# Altium footprint library Adafruit PyGamer1.PcbLib: 42 footprints (part 1 of 3)
Each footprint in its own frame and in the unit in brackets; x right, y up, seen from the top. Pads: shape width x height; smd on the part's side, far side on the other; paste and mask are expansions set on the pad; w line width, h text height; cw(c..) or ccw(c..) is an arc to the next point about the centre after c.
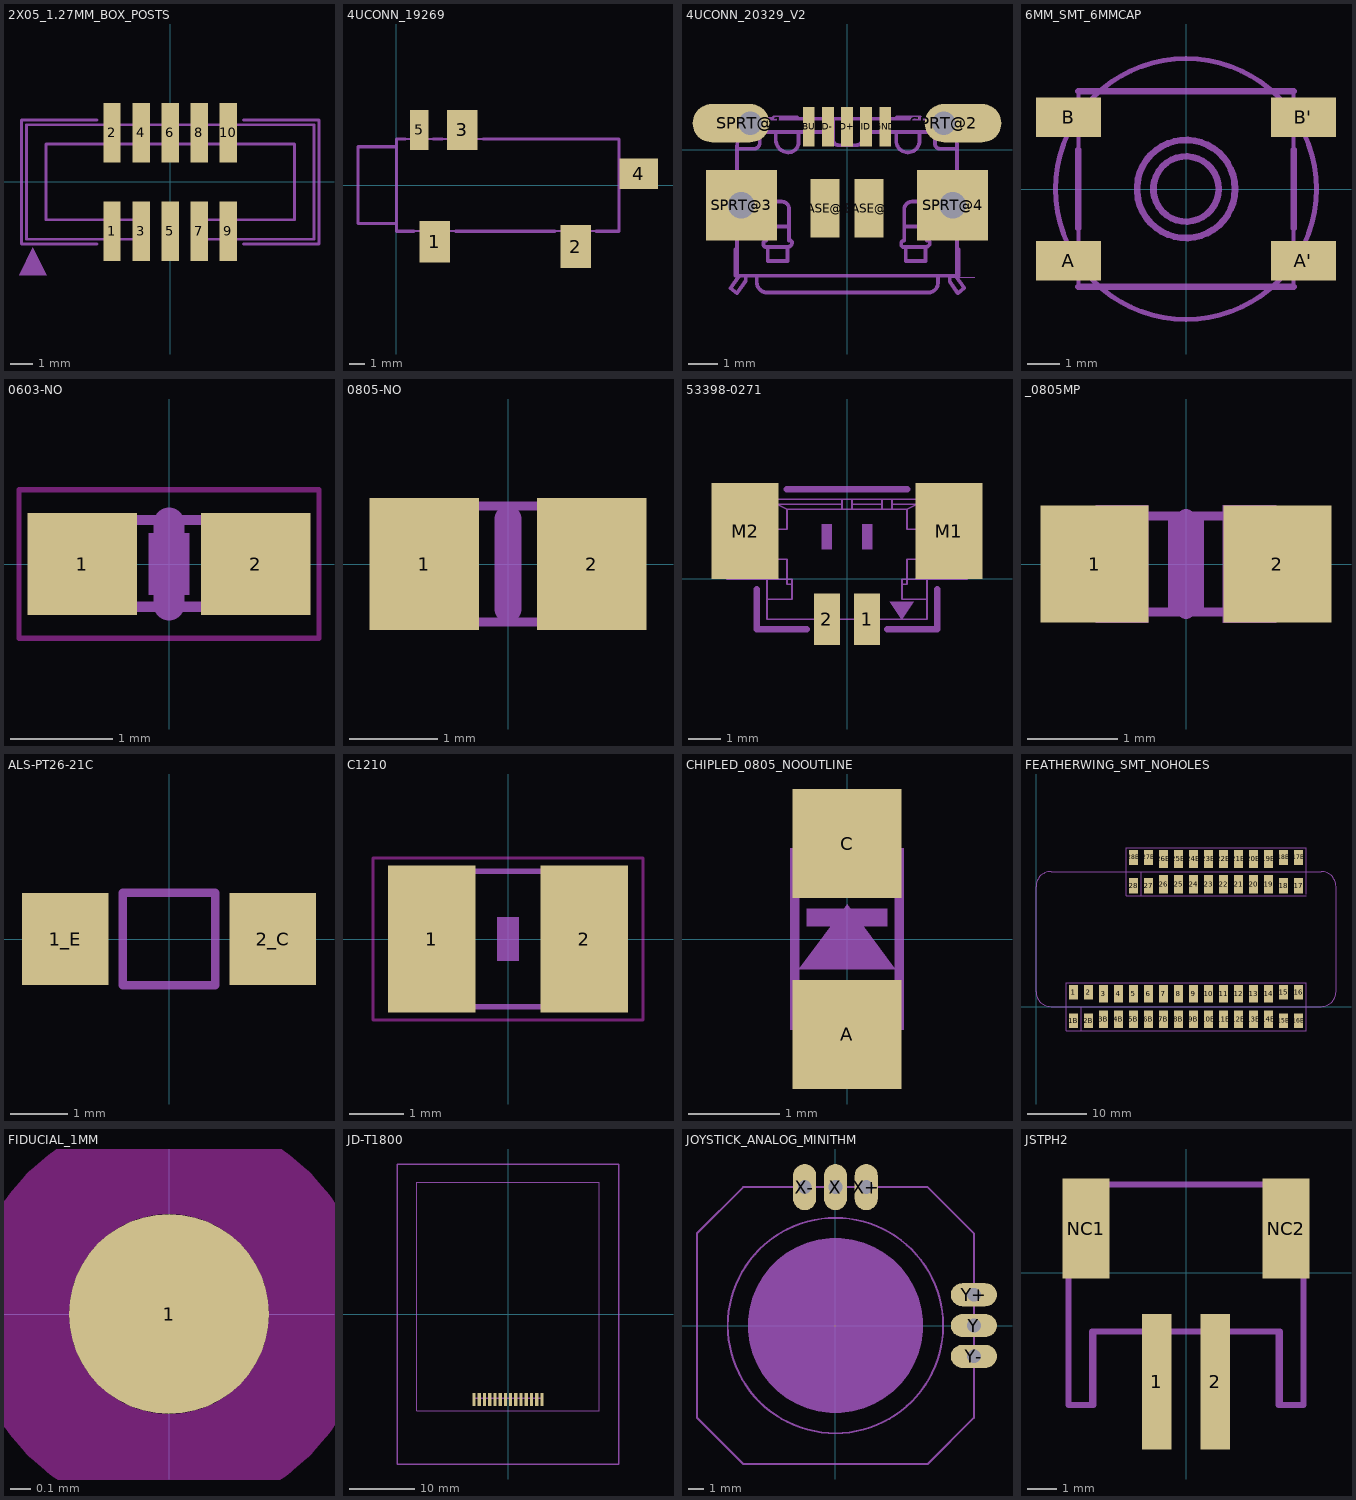
[diagram p0: the footprints below, top view; thin cyan lines are the x and y axes]

## 2X05_1.27MM_BOX_POSTS [mm]
pads (10):
  rect 0.76x2.6 smd: 1(-2.54,-2.15) 2(-2.54,2.15) 3(-1.27,-2.15) 4(-1.27,2.15) 5(0,-2.15) 6(0,2.15) 7(1.27,-2.15) 8(1.27,2.15) 9(2.54,-2.15) 10(2.54,2.15)
Mechanical 3:
  lines w0.127: -6.275,-2.5 -6.275,2.5 6.275,2.5 6.275,-2.5 1.25,-2.5 1.25,-1.65 5.425,-1.65 5.425,1.65 -5.425,1.65 -5.425,-1.65 -1.25,-1.65 -1.25,-2.5 -6.275,-2.5
Mechanical 7:
  region: -6.603,-4.063 -5.397,-4.063 -6,-2.858
  lines w0.127: -3.2,-2.7 -6.5,-2.7 -6.5,2.7 -3.2,2.7 ; 3.2,-2.7 6.5,-2.7 6.5,2.7 3.2,2.7

## 4UCONN_19269 [mm]
pads (5):
  rect 2x2.7 smd: 1(2.5,-3.7)
  rect 2x2.8 smd: 2(11.7,-4)
  rect 2x2.6 smd: 3(4.3,3.6)
  rect 2.5x2 smd: 4(15.8,0.75)
  rect 1.2x2.6 smd: 5(1.5,3.6)
Mechanical 3:
  region: 3.5,3 3.5,4.4 5.1,4.4 5.1,3
  region: 1.7,-4.45 1.7,-3.05 3.3,-3.05 3.3,-4.45
  region: 10.9,-4.45 10.9,-3.05 12.5,-3.05 12.5,-4.45
  region: 15.95,-0.05 14.55,-0.05 14.55,1.55 15.95,1.55
  region: 1.05,3 1.05,4.4 1.95,4.4 1.95,3
  region: 14.5,-0.1 14.5,1.6 16.7,1.6 16.7,-0.1
  region: 10.9,-5.2 10.9,-3 12.5,-3 12.5,-5.2
  region: 1.7,-4.7 1.7,-3 3.3,-3 3.3,-4.7
  region: 3.5,3 3.5,4.6 5.1,4.6 5.1,3
  region: 1,3 1,4.6 2,4.6 2,3
  lines w0.127: 0,-3 14.5,-3 ; 0,3 14.5,3
  lines w0.203: 0,-3 0,-2.5 ; 0,2.95 0,2.5 ; 14.5,-3 14.5,3 ; 0,-2.5 0,2.5 ; 0,-2.5 -2.5,-2.5 -2.5,2.5 0,2.5
Mechanical 7:
  lines w0.203: 0,-3 0,3 0.6,3 ; 0.05,-3 1.15,-3 ; 2.4,3 3,3 ; 3.85,-3 10.35,-3 ; 5.65,3 14.5,3 14.5,2.1 ; 13,-3 14.5,-3 14.5,-0.6

## 4UCONN_20329_V2 [mm]
pads (11):
  rect 1x2 smd: BASE@1(-0.75,-2) BASE@2(0.75,-2)
  rect 0.4x1.35 smd paste+0 mask+0: D+(0,0.775) D-(-0.65,0.775) GND(1.3,0.775) ID(0.65,0.775) VBUS(-1.3,0.775)
  oval 2.616x1.308 / inner round 0 / far side oval 2.616x1.308 hole 0.8 copper offset -0.654,0: SPRT@1(-3.3,0.9)
  oval 2.616x1.308 / inner round 0 / far side oval 2.616x1.308 hole 0.8 copper offset 0.654,0: SPRT@2(3.3,0.9)
  rect 2.413x2.413 / inner round 0 / far side rect 2.413x2.413 hole 0.9: SPRT@3(-3.6,-1.9) SPRT@4(3.6,-1.9)
Top Paste:
  region: -4.85,-3.15 -4.85,-0.65 -2.35,-0.65 -2.35,-3.15
  region: 2.35,-3.15 2.35,-0.65 4.85,-0.65 4.85,-3.15
  region: -1.45,0.15 -1.45,1.4 -1.15,1.4 -1.15,0.15
  region: -0.8,0.15 -0.8,1.4 -0.5,1.4 -0.5,0.15
  region: -0.15,0.15 -0.15,1.4 0.15,1.4 0.15,0.15
  region: 0.5,0.15 0.5,1.4 0.8,1.4 0.8,0.15
  region: 1.15,0.15 1.15,1.4 1.45,1.4 1.45,0.15
  region: -5.114,0.9 -5.109,0.773 -5.002,0.542 -4.815,0.369 -4.576,0.281 -4.449,0.287 -3.351,0.287 -3.224,0.281 -2.985,0.369 -2.798,0.542 -2.691,0.773 -2.687,0.9 -2.691,1.027 -2.798,1.258 -2.985,1.431 -3.224,1.519 -3.351,1.514 -4.449,1.514 -4.576,1.519 -4.815,1.431 -5.002,1.258 -5.109,1.027
  region: 2.687,0.9 2.691,0.773 2.798,0.542 2.985,0.369 3.224,0.281 3.351,0.287 4.449,0.287 4.576,0.281 4.815,0.369 5.002,0.542 5.109,0.773 5.114,0.9 5.109,1.027 5.002,1.258 4.815,1.431 4.576,1.519 4.449,1.514 3.351,1.514 3.224,1.519 2.985,1.431 2.798,1.258 2.691,1.027
Top Solder:
  region: -1.55,0.05 -1.55,1.5 -1.05,1.5 -1.05,0.05
  region: -0.9,0.05 -0.9,1.5 -0.4,1.5 -0.4,0.05
  region: -0.25,0.05 -0.25,1.5 0.25,1.5 0.25,0.05
  region: 0.4,0.05 0.4,1.5 0.9,1.5 0.9,0.05
  region: 1.05,0.05 1.05,1.5 1.55,1.5 1.55,0.05
Route Tool Path:
  lines w0: -4.05,-2.15 ccw(c-3.675,-2.175) -3.7,-2.55 -3.5,-2.55 ccw(c-3.525,-2.175) -3.15,-2.15 -3.15,-1.6 ccw(c-3.5,-1.6) -3.5,-1.25 -3.7,-1.25 ccw(c-3.7,-1.6) -4.05,-1.6 -4.05,-2.15 ; 3.15,-2.2 ccw(c3.55,-2.15) 3.6,-2.55 ccw(c3.65,-2.15) 4.05,-2.2 4.05,-1.6 ccw(c3.65,-1.65) 3.6,-1.25 ccw(c3.55,-1.65) 3.15,-1.6 3.15,-2.2
Mechanical 3:
  lines w0: 3.5,-4.35 4.35,-4.35
  lines w0.127: -3.725,0.025 -3.175,0.025 ccw(c-3.175,0.225) -2.975,0.225 -2.975,0.45 cw(c-2.825,0.45) -2.825,0.6 ; -3.425,0.625 -3.425,0.75 -3.575,0.75 -3.575,1.05 -0.475,1.05 ; -2,-3.325 -2.7,-3.325 ; -2,-2.625 -2.75,-2.625 ; -0.125,0.175 -0.125,0.65 0.1,0.65 0.1,0.175 ; 2.7,-3.325 2,-3.325 ; 2.7,-2.625 1.95,-2.625 ; 3.5,-4.35 3.5,-4.5 3.775,-4.9 4,-4.725 3.7,-4.3 ; 3.725,0.025 3.175,0.025 cw(c3.175,0.2) 3,0.2 3,0.525 ccw(c2.925,0.525) 2.925,0.6 ; -3.675,-4.3 -3.45,-4.3 ; -3.675,-4.3 -3.75,-4.3 -3.75,0.125 cw(c-3.275,0.125) -3.275,0.6 -2.825,0.6 ; -3.675,-4.3 -3.975,-4.725 -3.75,-4.9 -3.45,-4.475 -3.45,-4.3 ; -3.45,-4.3 -3.075,-4.3 ; -3.075,-4.3 3.1,-4.3 ; -3.075,-4.3 -3.075,-4.525 ccw(c-2.725,-4.525) -2.725,-4.875 2.775,-4.875 ccw(c2.775,-4.55) 3.1,-4.55 3.1,-4.3 ; -2.825,0.6 -2.5,0.6 ; -2.75,-2.625 -2.75,-3.1 ccw(c-2.75,-3.2) -2.85,-3.2 -2.85,-3.225 ccw(c-2.762,-3.238) -2.775,-3.325 -2.7,-3.325 ; -2.75,-2.625 -2.75,-2.05 cw(c-2.475,-2.05) -2.475,-1.775 -2.225,-1.775 cw(c-2.225,-2.025) -1.975,-2.025 -1.975,-3.1 -1.95,-3.1 cw(c-1.95,-3.175) -1.875,-3.175 cw(c-2.025,-3.175) -2.025,-3.325 -2.025,-3.8 -2.7,-3.8 -2.7,-3.325 ; -2.5,0.6 cw(c-2.5,0.525) -2.425,0.525 -2.425,0.325 ccw(c-2,0.325) -2,-0.1 ccw(c-2,0.25) -1.65,0.25 -1.65,0.6 ; -2.5,0.6 -1.65,0.6 ; -1.65,0.6 -0.475,0.6 ; -0.475,0.6 -0.475,0.325 ccw(c-0.3,0.325) -0.3,0.15 0.325,0.15 ccw(c0.325,0.35) 0.525,0.35 0.525,0.6 ; -0.475,0.6 -0.475,1.05 ; -0.475,1.05 0.525,1.05 ; 0.525,0.6 1.675,0.6 ; 0.525,0.6 0.525,1.05 ; 0.525,1.05 3.6,1.05 3.6,0.775 3.35,0.775 3.35,0.6 ; 1.675,0.6 2.475,0.6 ; 1.675,0.6 1.675,0.3 ccw(c2.075,0.3) 2.075,-0.1 ccw(c2.075,0.3) 2.475,0.3 2.475,0.6 ; 1.95,-2.625 1.95,-3.1 ccw(c1.95,-3.2) 1.85,-3.2 1.85,-3.225 ccw(c1.938,-3.237) 1.925,-3.325 2,-3.325 ; 1.95,-2.625 1.95,-2.05 cw(c2.225,-2.05) 2.225,-1.775 2.475,-1.775 cw(c2.475,-2.025) 2.725,-2.025 2.725,-3.1 2.75,-3.1 cw(c2.75,-3.175) 2.825,-3.175 cw(c2.675,-3.175) 2.675,-3.325 2.675,-3.8 2,-3.8 2,-3.325 ; 2.475,0.6 2.925,0.6 ; 2.925,0.6 3.35,0.6 ; 3.1,-4.3 3.7,-4.3 ; 3.35,0.6 cw(c3.35,0.2) 3.75,0.2 3.75,-4.3 3.7,-4.3
  text "PCB EDGE" at 0,-4 h0.63
Mechanical 7:
  lines w0.127: -3.8,-3.4 -3.8,-4.3 3.8,-4.3 3.8,-3.4 ; -2.5,1.1 -1.7,1.1 ; 1.7,1.1 2.5,1.1

## 6MM_SMT_6MMCAP [mm]
pads (4):
  rect 2x1.2 smd: A(-3.6,-2.2) A'(3.6,-2.2) B(-3.6,2.2) B'(3.6,2.2)
Mechanical 4:
  circle w0.152: c0,0 r4
  lines w0.127: -3.3,-3 -3.3,3 ; 3.3,-3 3.3,3
Mechanical 8:
  circle w0.203: c0,0 r1.503
  circle w0.203: c0,0 r1
  lines w0.203: -3.3,-3 3.3,-3 ; -3.3,-1.2 -3.3,1.2 ; -3.3,3 3.3,3 ; 3.3,-1.2 3.3,1.2

## 0603-NO [mm]
pads (2):
  rect 1.075x1 smd: 1(-0.85,0) 2(0.85,0)
Top Layer keep-out:
  lines w0.051: -1.473,-0.729 1.473,-0.729 1.473,0.729 -1.473,0.729 -1.473,-0.729
Mechanical 3:
  region: -0.838,-0.47 -0.838,0.48 -0.338,0.48 -0.338,-0.47
  region: 0.33,-0.47 0.33,0.48 0.83,0.48 0.83,-0.47
  lines w0.102: -0.356,-0.419 0.356,-0.419 ; -0.356,0.432 0.356,0.432
Mechanical 7:
  lines w0.305: 0,-0.4 0,0.4
Top Glue Points:
  region: -0.2,-0.3 -0.2,0.3 0.2,0.3 0.2,-0.3

## 0805-NO [mm]
pads (2):
  rect 1.24x1.5 smd: 1(-0.95,0) 2(0.95,0)
Mechanical 3:
  region: -1.092,-0.724 -1.092,0.726 -0.342,0.726 -0.342,-0.724
  region: 0.356,-0.724 0.356,0.726 1.106,0.726 1.106,-0.724
  lines w0.102: -0.381,0.66 0.381,0.66 ; -0.356,-0.66 0.381,-0.66
Mechanical 7:
  lines w0.305: 0,-0.508 0,0.508

## 53398-0271 [mm]
pads (4):
  rect 0.8x1.6 smd: 1(0.625,-1.27) 2(-0.625,-1.27)
  rect 2.1x3 smd: M1(3.185,1.48) M2(-3.185,1.48)
Mechanical 3:
  region: -0.781,0.917 -0.781,1.699 -0.469,1.699 -0.469,0.917
  region: 0.469,0.917 0.469,1.699 0.781,1.699 0.781,0.917
  lines w0.051: -0.156,2.324 -2.187,2.324 ; 0.156,2.324 1.094,2.324 ; -2.5,-0.645 -2.5,-0.02 ; -2.5,-0.645 -2.5,-1.27 2.5,-1.27 2.5,-0.645 ; -2.5,-0.645 -1.719,-0.645 -1.719,-0.176 ; -2.5,-0.02 -3.75,-0.02 -3.75,2.48 -0.156,2.48 ; -2.5,-0.02 -2.187,-0.02 ; -2.187,-0.02 -1.875,-0.02 ; -2.187,-0.02 -2.187,0.605 ; -2.187,0.605 -2.187,1.543 ; -2.187,0.605 -1.875,0.605 -1.875,-0.02 ; -2.187,1.543 -2.187,2.324 ; -2.187,1.543 -1.875,1.543 -1.875,2.167 ; -2.187,2.324 -1.875,2.167 ; -1.875,-0.02 -1.719,-0.02 -1.719,-0.176 ; -1.875,-0.02 -1.875,-0.176 -1.719,-0.176 ; -1.875,2.167 -0.156,2.167 ; -0.156,2.167 0.156,2.167 ; -0.156,2.167 -0.156,2.48 ; -0.156,2.48 0.156,2.48 ; 0.156,2.167 1.094,2.167 ; 0.156,2.167 0.156,2.48 ; 0.156,2.48 1.094,2.48 ; 1.094,2.167 1.406,2.167 ; 1.094,2.167 1.094,2.324 ; 1.094,2.324 1.094,2.48 ; 1.094,2.48 1.406,2.48 ; 1.406,2.167 1.875,2.167 ; 1.406,2.167 1.406,2.324 ; 1.406,2.324 1.406,2.48 ; 1.406,2.324 2.187,2.324 ; 1.406,2.48 3.75,2.48 3.75,-0.02 2.5,-0.02 ; 1.719,-0.176 1.719,-0.02 1.875,-0.02 ; 1.719,-0.176 1.719,-0.645 2.5,-0.645 ; 1.719,-0.176 1.875,-0.176 1.875,-0.02 ; 1.875,-0.02 2.187,-0.02 ; 1.875,-0.02 1.875,0.605 2.187,0.605 ; 1.875,2.167 1.875,1.543 2.188,1.543 ; 1.875,2.167 2.187,2.324 ; 2.187,-0.02 2.187,0.605 ; 2.187,-0.02 2.5,-0.02 ; 2.187,0.605 2.188,1.543 ; 2.187,2.324 2.188,2.324 2.188,1.543 ; 2.5,-0.645 2.5,-0.02 ; 2.444,0.399 3.538,0.399 3.538,2.118 2.444,2.118 2.444,0.399
  text "1" at 2.756,0.867 h1.26
Mechanical 7:
  region: 1.332,-0.728 2.078,-0.728 1.705,-1.287
  lines w0.203: -2.813,-0.332 -2.813,-1.583 -1.25,-1.583 ; -1.875,2.792 1.875,2.792 ; 1.25,-1.583 2.813,-1.583 2.813,-0.332

## _0805MP [mil]
pads (2):
  rect 47.24x51.18 smd: 1(-40,0) 2(40,0)
Mechanical 3:
  region: 16,-25.59 16,25.59 39.37,25.59 39.37,-25.59
  region: -39.37,-25.59 -39.37,25.59 -16.41,25.59 -16.41,-25.59
  lines w4: -20.08,-21.06 20.08,-21.06 ; -20.08,21.06 20.08,21.06
Mechanical 7:
  lines w8: 0,-20 0,20
Top Glue Points:
  region: -7.87,-19.69 -7.87,19.69 7.87,19.69 7.87,-19.69

## ALS-PT26-21C [mm]
pads (2):
  rect 1.5x1.6 smd paste+0: 1_E(-1.8,0) 2_C(1.8,0)
Top Paste:
  region: -2.5,-0.8 -2.5,0.8 -1.3,0.8 -1.3,-0.8
  region: 1.3,-0.8 1.3,0.8 2.5,0.8 2.5,-0.8
Mechanical 3:
  text "E" at -2.3,-0.5 h1.57
  text "C" at 1.4,-0.4 h1.57
Mechanical 19:
  lines w0.152: -0.8,-0.8 -0.8,0.8 0.8,0.8 0.8,-0.8 -0.8,-0.8

## C1210 [mm]
pads (2):
  rect 1.6x2.7 smd: 1(-1.4,0) 2(1.4,0)
Top Layer keep-out:
  lines w0.051: -2.473,-1.483 2.473,-1.483 2.473,1.483 -2.473,1.483 -2.473,-1.483
Mechanical 3:
  region: -1.702,-1.295 -1.702,1.305 -0.952,1.305 -0.952,-1.295
  region: 0.952,-1.305 0.952,1.295 1.702,1.295 1.702,-1.305
  lines w0.102: -0.965,-1.245 0.965,-1.245 ; -0.965,1.245 0.965,1.245
Top Glue Points:
  region: -0.2,-0.4 -0.2,0.4 0.2,0.4 0.2,-0.4

## CHIPLED_0805_NOOUTLINE [mm]
pads (2):
  rect 1.2x1.2 smd: A(0,-1.05) C(0,1.05)
Mechanical 3:
  circle w0.076: c-0.45,0.85 r0.103
  region: 0.3,0.5 0.3,1 0.625,1 0.625,0.5
  region: -0.325,0.5 -0.325,0.75 -0.175,0.75 -0.175,0.5
  region: 0.175,0.5 0.175,0.75 0.325,0.75 0.325,0.5
  region: -0.2,0.5 -0.2,0.675 0.2,0.675 0.2,0.5
  region: 0.3,-1 0.3,-0.5 0.625,-0.5 0.625,-1
  region: -0.625,-1 -0.625,-0.5 -0.3,-0.5 -0.3,-1
  region: 0.175,-0.75 0.175,-0.5 0.325,-0.5 0.325,-0.75
  region: -0.325,-0.75 -0.325,-0.5 -0.175,-0.5 -0.175,-0.75
  region: -0.2,-0.675 -0.2,-0.5 0.2,-0.5 0.2,-0.675
  region: -0.6,0.5 -0.6,0.762 -0.3,0.762 -0.3,0.5
  region: -0.625,0.925 -0.625,1 -0.3,1 -0.3,0.925
  lines w0.102: -0.575,-0.5 -0.575,0.925 ; -0.35,-0.925 cw(c0,-0.979) 0.35,-0.925 ; -0.35,0.925 ccw(c0,0.979) 0.35,0.925 ; 0.575,-0.525 0.575,0.525
  text "A" at -0.1,-1.4 h0.39
  text "C" at -0.1,1.2 h0.39
Mechanical 7:
  region: -0.445,0.14 -0.445,0.331 0.445,0.331 0.445,0.14
  region: 0,0.381 -0.533,-0.33 0.533,-0.33

## FEATHERWING_SMT_NOHOLES [mil]
pads (56):
  rect 60x100 smd: 1(250,95) 1B(250,-95) 2(350,95) 2B(350,-95) 15(1650,95) 15B(1650,-95) 16(1750,95) 16B(1750,-95) 17(1750,805) 17B(1750,995) 18(1650,805) 18B(1650,995) 27(750,805) 27B(750,995) 28(650,805) 28B(650,995)
  rect 60x120 smd: 3(450,85) 3B(450,-85) 4(550,85) 4B(550,-85) 5(650,85) 5B(650,-85) 6(750,85) 6B(750,-85) 7(850,85) 7B(850,-85) 8(950,85) 8B(950,-85) 9(1050,85) 9B(1050,-85) 10(1150,85) 10B(1150,-85) 11(1250,85) 11B(1250,-85) 12(1350,85) 12B(1350,-85) 13(1450,85) 13B(1450,-85) 14(1550,85) 14B(1550,-85) 19(1550,815) 19B(1550,985) 20(1450,815) 20B(1450,985) 21(1350,815) 21B(1350,985) 22(1250,815) 22B(1250,985) 23(1150,815) 23B(1150,985) 24(1050,815) 24B(1050,985) 25(950,815) 25B(950,985) 26(850,815) 26B(850,985)
Mechanical 3:
  lines w0: 0,100 ccw(c100,100) 100,0 1900,0 ccw(c1900,100) 2000,100 2000,800 ccw(c1900,800) 1900,900 1800,900 100,900 ccw(c100,800) 0,800 0,100
Mechanical 7:
  lines w8: 1800,740 700,740 ; 1800,750 1800,900 1800,1060 600,1060 600,900 ; 200,0 200,-160 300,-160 ; 200,0 200,160 1800,160 1800,-160 300,-160 ; 200,0 300,0 300,-160 ; 600,900 600,740 700,740 ; 600,900 700,900 700,740

## FIDUCIAL_1MM [mm]
pads (1):
  rrect100% 1x1 smd paste+0: 1(0,0)
Top Layer keep-out:
  lines w0.5: -0.75,0 cw(c0,0) 0,0.75 ; -0.75,0 ccw(c0,0) 0,-0.75 ; -0.75,0 cw(c0,0) 0,0.75 ; -0.75,0 ccw(c0,0) 0,-0.75 ; 0,-0.75 ccw(c0,0) 0.75,0 ; 0,-0.75 ccw(c0,0) 0.75,0 ; 0,0.75 cw(c0,0) 0.75,0 ; 0,0.75 cw(c0,0) 0.75,0
Top Solder:
  lines w0.5: -0.75,0 cw(c0,0) 0,0.75 cw(c0,0) 0.75,0 cw(c0,0) 0,-0.75 cw(c0,0) -0.75,0

## JD-T1800 [mm]
pads (14):
  rect 0.5x2 smd paste+0: 1(5.2,-13.1) 2(4.4,-13.1) 3(3.6,-13.1) 4(2.8,-13.1) 5(2,-13.1) 6(1.2,-13.1) 7(0.4,-13.1) 8(-0.4,-13.1) 9(-1.2,-13.1) 10(-2,-13.1) 11(-2.8,-13.1) 12(-3.6,-13.1) 13(-4.4,-13.1) 14(-5.2,-13.1)
Mechanical 4:
  lines w0.152: -14,-14.8 14,-14.8 14,20.2 -14,20.2 -14,-14.8
Mechanical 8:
  lines w0.203: -5.2,-12.9 5.2,-12.9 ; -17,-23 17,-23 17,23 -17,23 -17,-23

## JOYSTICK_ANALOG_MINITHM [mm]
pads (6):
  oval 1.5x3 / inner round 0 / far side oval 1.5x3 hole 0.9: X(0,9) X+(2,9) X-(-2,9)
  oval 3x1.5 / inner round 0 / far side oval 3x1.5 hole 0.9: Y(9,0) Y+(9,2) Y-(9,-2)
Mechanical 8:
  circle w0.127: c0,0 r7
  region: 0,5.663 0.371,5.663 1.107,5.567 1.824,5.374 2.51,5.09 3.153,4.719 3.742,4.267 4.267,3.742 4.719,3.153 5.09,2.51 5.374,1.824 5.567,1.107 5.663,0.371 5.663,0 5.663,-0.371 5.567,-1.107 5.374,-1.824 5.09,-2.51 4.719,-3.153 4.267,-3.742 3.742,-4.267 3.153,-4.719 2.51,-5.09 1.824,-5.374 1.107,-5.567 0.371,-5.663 0,-5.663 -0.371,-5.663 -1.107,-5.567 -1.824,-5.374 -2.51,-5.09 -3.153,-4.719 -3.742,-4.267 -4.267,-3.742 -4.719,-3.153 -5.09,-2.51 -5.374,-1.824 -5.567,-1.107 -5.663,-0.371 -5.663,0 -5.663,0.371 -5.567,1.107 -5.374,1.824 -5.09,2.51 -4.719,3.153 -4.267,3.742 -3.742,4.267 -3.153,4.719 -2.51,5.09 -1.824,5.374 -1.107,5.567 -0.371,5.663
  lines w0.127: -9,-6 -6,-9 6,-9 9,-6 9,6 6,9 -6,9 -9,6 -9,-6

## JSTPH2 [mm]
pads (4):
  rect 1x4.6 smd: 1(-1,-3.7) 2(1,-3.7)
  rect 1.6x3.4 smd: NC1(-3.4,1.5) NC2(3.4,1.5)
Mechanical 3:
  lines w0.203: -4,-4.5 -4,3 4,3 4,-4.5 3.2,-4.5 3.2,-2 -3.2,-2 -3.2,-4.5 -4,-4.5
Mechanical 7:
  lines w0.203: -4,-0.5 -4,-4.5 -3.15,-4.5 -3.15,-2 -1.75,-2 ; -2.25,3 2.25,3 ; 1.75,-2 3.15,-2 3.15,-4.5 4,-4.5 4,-0.5